# Altium footprint library CATS-Vega.PcbLib: 42 footprints (part 2 of 3)
Each footprint in its own frame and in the unit in brackets; x right, y up, seen from the top. Pads: shape width x height; smd on the part's side, far side on the other; paste and mask are expansions set on the pad; w line width, h text height; cw(c..) or ccw(c..) is an arc to the next point about the centre after c.
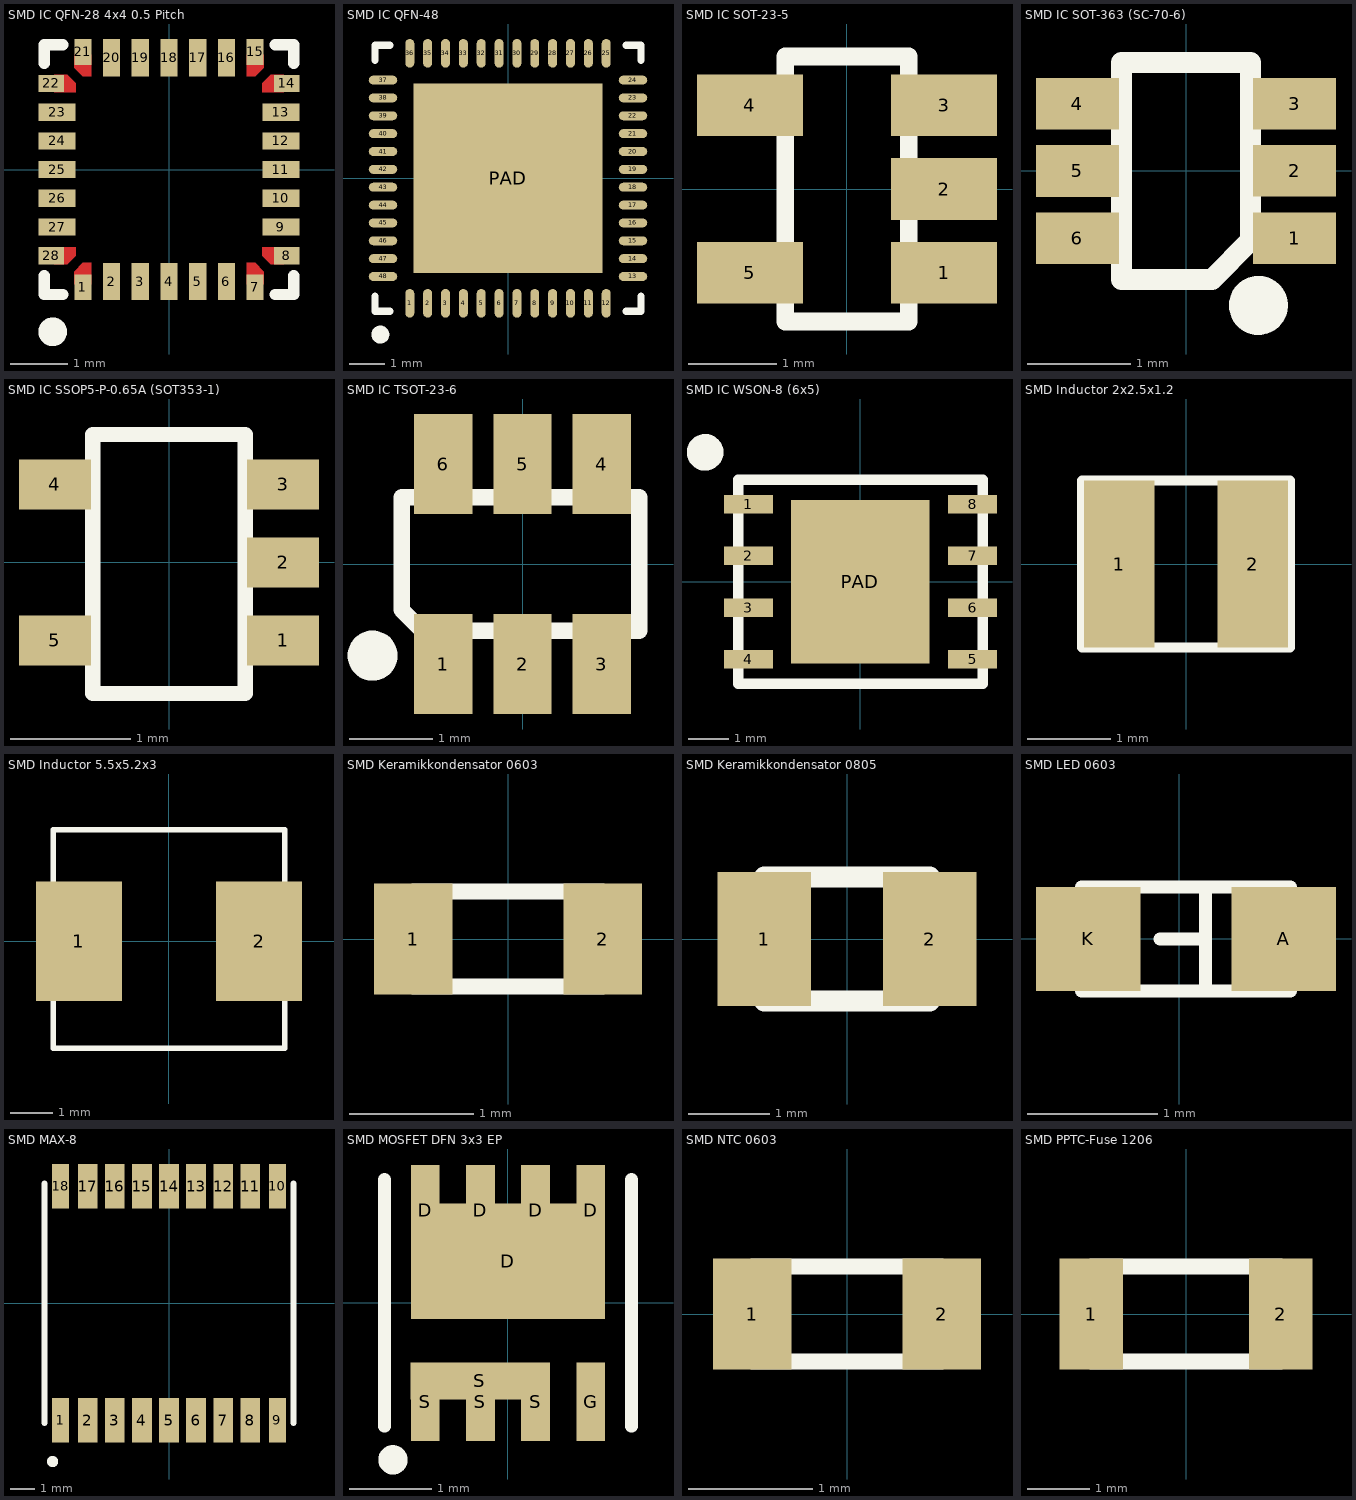
[diagram p1: the footprints below, top view; thin cyan lines are the x and y axes]

## SMD IC QFN-28 4x4 0.5 Pitch [mm] "QFN, 28-Leads"
height 1
pads (28):
  rect 0.3x0.45 smd: 1(-1.5,-2.05) 7(1.5,-2.05) 15(1.5,2.05) 21(-1.5,2.05)
  rect 0.3x0.65 smd: 2(-1,-1.95) 3(-0.5,-1.95) 4(0,-1.95) 5(0.5,-1.95) 6(1,-1.95) 16(1,1.95) 17(0.5,1.95) 18(0,1.95) 19(-0.5,1.95) 20(-1,1.95)
  rect 0.45x0.3 smd: 8(2.05,-1.5) 14(2.05,1.5) 22(-2.05,1.5) 28(-2.05,-1.5)
  rect 0.65x0.3 smd: 9(1.95,-1) 10(1.95,-0.5) 11(1.95,0) 12(1.95,0.5) 13(1.95,1) 23(-1.95,1) 24(-1.95,0.5) 25(-1.95,0) 26(-1.95,-0.5) 27(-1.95,-1)
Top Layer:
  region: 1.35,-2 1.35,-1.625 1.5,-1.625 1.65,-1.775 1.65,-2
  region: 2,-1.35 1.625,-1.35 1.625,-1.5 1.775,-1.65 2,-1.65
  region: -2,-1.35 -1.625,-1.35 -1.625,-1.5 -1.775,-1.65 -2,-1.65
  region: -1.35,-2 -1.35,-1.625 -1.5,-1.625 -1.65,-1.775 -1.65,-2
  region: -2,1.35 -1.625,1.35 -1.625,1.5 -1.775,1.65 -2,1.65
  region: -1.35,2 -1.35,1.625 -1.5,1.625 -1.65,1.775 -1.65,2
  region: 2,1.35 1.625,1.35 1.625,1.5 1.775,1.65 2,1.65
  region: 1.35,2 1.35,1.625 1.5,1.625 1.65,1.775 1.65,2
Top Overlay:
  circle w0.25: c-2.025,-2.825 r0.125
  lines w0.2: -2.175,-1.85 -2.175,-2.175 -1.85,-2.175 ; -2.175,1.85 -2.175,2.175 -1.85,2.175 ; 1.85,-2.175 2.175,-2.175 2.175,-1.85 ; 1.85,2.175 2.175,2.175 2.175,1.85
3D body "User Library-ATmega 168.step": height 0.8, standoff -0.02, extent -2.001,-2.001 2.001,2.001

## SMD IC QFN-48 [mm] "QFN, 48-Leads, Body 7x7mm, Pitch 0.5mm, IPC Medium Density"
height 0.9
pads (49):
  oval 0.25x0.8 smd: 1(-2.75,-3.5) 2(-2.25,-3.5) 3(-1.75,-3.5) 4(-1.25,-3.5) 5(-0.75,-3.5) 6(-0.25,-3.5) 7(0.25,-3.5) 8(0.75,-3.5) 9(1.25,-3.5) 10(1.75,-3.5) 11(2.25,-3.5) 12(2.75,-3.5) 25(2.75,3.5) 26(2.25,3.5) 27(1.75,3.5) 28(1.25,3.5) 29(0.75,3.5) 30(0.25,3.5) 31(-0.25,3.5) 32(-0.75,3.5) 33(-1.25,3.5) 34(-1.75,3.5) 35(-2.25,3.5) 36(-2.75,3.5)
  oval 0.8x0.25 smd: 13(3.5,-2.75) 14(3.5,-2.25) 15(3.5,-1.75) 16(3.5,-1.25) 17(3.5,-0.75) 18(3.5,-0.25) 19(3.5,0.25) 20(3.5,0.75) 21(3.5,1.25) 22(3.5,1.75) 23(3.5,2.25) 24(3.5,2.75) 37(-3.5,2.75) 38(-3.5,2.25) 39(-3.5,1.75) 40(-3.5,1.25) 41(-3.5,0.75) 42(-3.5,0.25) 43(-3.5,-0.25) 44(-3.5,-0.75) 45(-3.5,-1.25) 46(-3.5,-1.75) 47(-3.5,-2.25) 48(-3.5,-2.75)
  rect 5.3x5.3 smd: PAD(0,0)
Top Overlay:
  circle w0.25: c-3.575,-4.375 r0.125
  lines w0.2: -3.725,-3.3 -3.725,-3.725 -3.3,-3.725 ; -3.725,3.3 -3.725,3.725 -3.3,3.725 ; 3.3,-3.725 3.725,-3.725 3.725,-3.3 ; 3.3,3.725 3.725,3.725 3.725,3.3
3D body "User Library-QFN48_7x7.step": height 0.78, standoff -0.02, extent -3.51,-3.51 3.51,3.51

## SMD IC SOT-23-5 [mm]
pads (5):
  rect 1.2x0.7 smd: 1(1.1,-0.95) 2(1.1,0) 3(1.1,0.95) 4(-1.1,0.95) 5(-1.1,-0.95)
Top Overlay:
  lines w0.203: -0.7,-1.5 -0.7,1.5 0,1.5 0.7,1.5 0.7,-1.5 0,-1.5 -0.7,-1.5
3D body "CircuitWorks-SOT-23-5.step": height 1.1, standoff 0, extent -1.301,-1.5 1.199,1.5

## SMD IC SOT-363 (SC-70-6) [mm]
height 1.7
pads (6):
  rect 0.8x0.5 smd: 1(1.05,-0.65) 2(1.05,0) 3(1.05,0.65) 4(-1.05,0.65) 5(-1.05,0) 6(-1.05,-0.65)
Top Overlay:
  circle w0.37: c0.7,-1.3 r0.1
  lines w0.203: -0.625,-1.05 0.25,-1.05 0.625,-0.675 0.625,1.05 -0.625,1.05 -0.625,-1.05
3D body "User Library-SC70-6.step": height 0.92, standoff -0.03, extent -1.05,-1 1.05,1

## SMD IC SSOP5-P-0.65A (SOT353-1) [mm]
pads (5):
  rect 0.6x0.42 smd: 1(0.95,-0.65) 2(0.95,0) 3(0.95,0.65) 4(-0.95,0.65) 5(-0.95,-0.65)
Top Overlay:
  lines w0.127: -0.635,-1.092 0.635,-1.092 0.635,1.067 -0.635,1.067 -0.635,-1.092
3D body "SOT353-1.step": height 0.93, standoff -0.02, extent -1.05,-1.083 1.05,1.067

## SMD IC TSOT-23-6 [mm] "SOT-223/SC-73; 4 Leads; Body 6.7 x 7.3 mm, inc. leads (LxW max)"
height 1.8
pads (6):
  rect 0.7x1.2 smd: 1(-0.95,-1.2) 2(0,-1.2) 3(0.95,-1.2) 4(0.95,1.2) 5(0,1.2) 6(-0.95,1.2)
Top Overlay:
  circle w0.4: c-1.8,-1.1 r0.1
  lines w0.2: -1.45,-0.55 -1.2,-0.8 1.4,-0.8 1.4,0.8 -1.45,0.8 -1.45,-0.55
3D body "User Library-TSOT-23.step": height 0.86, standoff 0, extent -1.5,-1.405 1.5,1.405

## SMD IC WSON-8 (6x5) [mm]
height 1.7
pads (9):
  rect 1.2x0.45 smd: 1(-2.75,1.905) 2(-2.75,0.635) 3(-2.75,-0.635) 4(-2.75,-1.905) 5(2.75,-1.905) 6(2.75,-0.635) 7(2.75,0.635) 8(2.75,1.905)
  rect 3.4x4 smd: PAD(0,0)
Top Overlay:
  circle w0.5: c-3.81,3.175 r0.2
  lines w0.254: -3,-2.5 -3,2.5 3,2.5 3,-2.5 -3,-2.5
3D body "User Library-8 WSON.step": height 0.75, standoff 0, extent -3,-2.5 3,2.5

## SMD Inductor 2x2.5x1.2 [mm]
height 1.7
pads (2):
  rect 0.85x2 smd: 1(-0.8,0) 2(0.8,0)
Top Overlay:
  lines w0.12: -1.25,-1 0,-1 1.25,-1 1.25,1 0,1 -1.25,1 -1.25,-1
3D body "74404024010_Download_STP_WE-LQS-2512_rev1.stp": height 1.2, standoff 0, extent -1.25,-1 1.25,1

## SMD Inductor 5.5x5.2x3 [mm]
height 1.7
pads (2):
  rect 2x2.79 smd: 1(-2.1,0) 2(2.1,0)
Top Overlay:
  lines w0.127: -2.7,-2.5 2.7,-2.5 2.7,2.6 -2.7,2.6 -2.7,-2.5
3D body "IHLP2020CZ.STEP": height 2.89, standoff 0.03, extent -2.725,-2.546 2.725,2.6

## SMD Keramikkondensator 0603 [mil]
height 66.93
pads (2):
  rect 25x35 smd: 1(-30,0) 2(30,0)
Top Overlay:
  lines w5: -30,-15 30,-15 30,15 -30,15 -30,-15
3D body "User Library-0603_Cap.STEP": height 31.69, standoff 0, extent -31.49,-15.74 31.5,15.75

## SMD Keramikkondensator 0805 [mil]
height 66.93
pads (2):
  rect 45x65 smd: 1(-40,0) 2(40,0)
Top Overlay:
  lines w10: -40,-30 -40,30 40,30 40,-30 -40,-30
3D body "User Library-0805 SMD Capacitor.step": height 30.79, standoff 0, extent -39.36,-24.6 39.38,24.61

## SMD LED 0603 [mm] "SMD_LED_RED"
height 8.65
pads (2):
  rect 0.8x0.8 smd: A(0.8,0) K(-0.7,0)
Top Overlay:
  lines w0.1: -0.15,0 0.2,0 ; 0.2,-0.4 0.2,0.4 ; -0.75,-0.4 0.85,-0.4 0.85,0.4 -0.75,0.4 -0.75,-0.4
3D body "User Library-LED SMD0603.step": height 0.68, standoff 0, extent -0.793,-0.357 0.857,0.368

## SMD MAX-8 [mm]
pads (18):
  rect 0.7x1.8 smd: 1(-4.4,-4.75) 9(4.4,-4.75) 10(4.4,4.75) 18(-4.4,4.75)
  rect 0.8x1.8 smd: 2(-3.3,-4.75) 3(-2.2,-4.75) 4(-1.1,-4.75) 5(0,-4.75) 6(1.1,-4.75) 7(2.2,-4.75) 8(3.3,-4.75) 11(3.3,4.75) 12(2.2,4.75) 13(1.1,4.75) 14(0,4.75) 15(-1.1,4.75) 16(-2.2,4.75) 17(-3.3,4.75)
Top Overlay:
  circle w0.254: c-4.725,-6.425 r0.1
  lines w0.254: -5.05,-4.85 -5.05,4.85 ; 5.05,-4.85 5.05,4.85
3D body "User Library-MAX-M8 u-blox M8 Concurrent GNSS Module.step": height 2.5, standoff 0, extent -5.05,-4.851 5.05,4.851

## SMD MOSFET DFN 3x3 EP [mm]
height 1.7
pads (10):
  rect 0.35x1.1 smd: D(-1.005,1.125) D(-0.335,1.125) D(0.335,1.125) D(1.005,1.125)
  rect 2.36x1.4 smd: D(0,0.508)
  rect 0.35x0.95 smd: G(1.005,-1.2) S(-1.005,-1.2) S(-0.335,-1.2) S(0.335,-1.2)
  rect 1.68x0.45 smd: S(-0.341,-0.947)
Top Overlay:
  circle w0.254: c-1.397,-1.905 r0.051
  lines w0.152: -1.5,-1.5 -1.5,1.5 ; 1.5,-1.5 1.5,1.5
3D body: height 0.5, standoff 0, extent -1.5,-1.5 1.5,1.5

## SMD NTC 0603 [mil]
height 66.93
pads (2):
  rect 25x35 smd: 1(-30,0) 2(30,0)
Top Overlay:
  lines w5: -30,-15 30,-15 30,15 -30,15 -30,-15
3D body "User Library-BLM18K.step": height 32.68, standoff 1.18, extent -31.5,-15.75 31.5,15.75

## SMD PPTC-Fuse 1206 [mil]
height 66.93
pads (2):
  rect 40x70 smd: 1(-60,0) 2(60,0)
Top Overlay:
  lines w10: -60,-30 60,-30 60,30 -60,30 -60,-30
3D body "User Library-Fuse1206.step": height 22.44, standoff -0.39, extent -63.03,-32.88 63.03,32.87